# Altium footprint library Inductor.PcbLib: 39 footprints (part 2 of 3)
Each footprint in its own frame and in the unit in brackets; x right, y up, seen from the top. Pads: shape width x height; smd on the part's side, far side on the other; paste and mask are expansions set on the pad; w line width, h text height; cw(c..) or ccw(c..) is an arc to the next point about the centre after c.
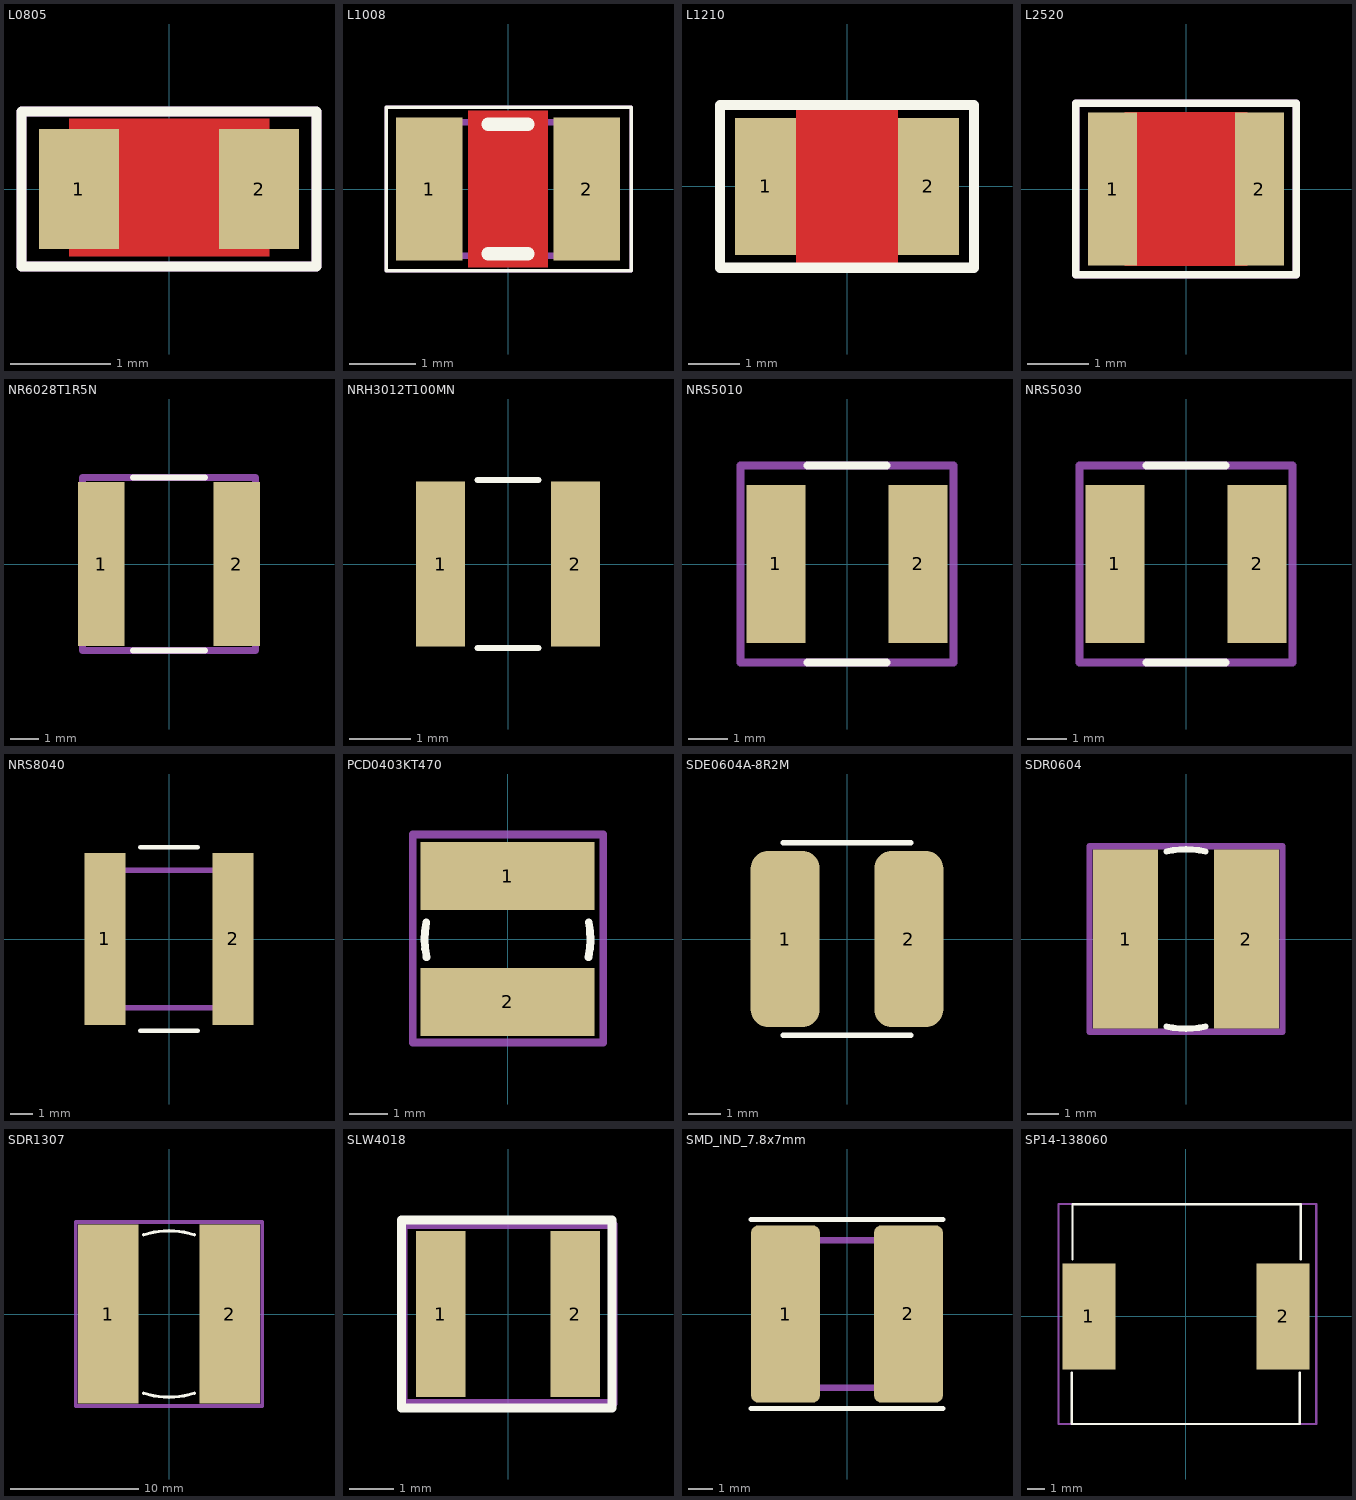
[diagram p1: the footprints below, top view; thin cyan lines are the x and y axes]

## L0805 [mm]
pads (2):
  rect 0.8x1.2 smd: 1(-0.9,0) 2(0.9,0)
Top Layer:
  pour cut-out: -1,0.7 -1,-0.675 1,-0.675 1,0.7
Top Overlay:
  lines w0.1: -1.475,-0.775 1.475,-0.775 1.475,0.775 -1.475,0.775 -1.475,-0.775
Mechanical 13:
  lines w0.1: -1.475,-0.775 -1.475,0.775 1.475,0.775 1.475,-0.775 -1.475,-0.775
  text ".Designator" at -1.375,-0.2 h0.8
Mechanical 15:
  lines w0.1: -1.475,-0.775 -1.475,0.775 1.475,0.775 1.475,-0.775 -1.475,-0.775
  text ".Comment" at -1.4,-0.225 h0.8
3D body "0805 SMD Capacitor.step": height 0.8, standoff 0.02, extent -1,-0.625 1,0.625

## L1008 [mm] "Chip Inductor, 2-Leads, Body 2.50x2.00mm, IPC Medium Density"
height 2
pads (2):
  rect 1x2.14 smd: 1(-1.18,0) 2(1.18,0)
Top Layer:
  pour cut-out: -0.6,1.175 -0.6,-1.175 0.6,-1.175 0.6,1.175
Top Overlay:
  lines w0.05: -1.825,-1.225 -1.825,1.225 1.85,1.225 1.85,-1.225 -1.825,-1.225
  lines w0.2: -0.3,-0.97 0.3,-0.97 ; -0.3,0.97 0.3,0.97
Mechanical 13:
  lines w0.1: -1.25,-1 1.25,-1 1.25,1 -1.25,1 -1.25,-1
Mechanical 15:
  lines w0.05: -1.825,-1.225 1.85,-1.225 1.85,1.225 -1.825,1.225 -1.825,-1.225
3D body "INDC2520X20N.step": height 2, standoff 0, extent -1.25,-1 1.25,1

## L1210 [mm]
pads (2):
  rect 1.2x2.7 smd: 1(-1.6,0) 2(1.6,0)
Top Layer:
  pour cut-out: -1,1.5 -1,-1.7 1,-1.7 1,1.5
Top Overlay:
  lines w0.2: -2.5,-1.6 -2.5,1.6 2.5,1.6 2.5,-1.6 -2.5,-1.6
Mechanical 13:
  text ".Designator" at -2.005,-0.381 h1
Mechanical 15:
  text ".Comment" at -1.751,-0.381 h1
3D body "User Library-3225.STEP": height 1.9, standoff 0, extent -1.6,-1.25 1.6,1.25

## L2520 [mm]
pads (2):
  rect 0.8x2.5 smd: 1(-1.2,0) 2(1.2,0)
Top Layer:
  pour cut-out: -1,1.25 -1,-1.25 1,-1.25 1,1.25
Top Overlay:
  lines w0.127: -1.8,-1.4 -1.8,1.4 1.8,1.4 1.8,-1.4 -1.8,-1.4
Mechanical 13:
  lines w0.127: -1.8,-1.4 -1.8,1.4 1.8,1.4 1.8,-1.4 -1.8,-1.4
  text ".Designator" at -0.943,-0.304 h1
Mechanical 15:
  lines w0.127: -1.8,-1.4 1.8,-1.4 1.8,1.4 -1.8,1.4 -1.8,-1.4
  text ".Comment" at -0.816,-0.304 h1
3D body: height 0.9, standoff 0, extent -1.3,-1 1.3,1

## NR6028T1R5N [mm] "FIXED IND 1.5UH 4.2A 20.8 MOHM"
pads (2):
  rect 1.6x5.7 smd: 1(-2.35,0) 2(2.35,0)
Top Overlay:
  lines w0.2: -1.25,-3 1.25,-3 ; -1.25,3 1.25,3
Mechanical 13:
  lines w0.254: -3,-3 -3,3 3,3 3,-3 -3,-3
  text ".Designator" at -2.921,-0.635 h1.5
Mechanical 15:
  lines w0.254: -3,-3 3,-3 3,3 -3,3 -3,-3
  text ".Comment" at -2.921,-0.635 h1.5
3D body "STEP-WE-LQS-6028-rev1.stp": height 2.83, standoff 0.02, extent -3,-3 3,3

## NRH3012T100MN [mm]
pads (2):
  rect 0.8x2.7 smd: 1(-1.1,0) 2(1.1,0)
Top Overlay:
  lines w0.1: -0.5,-1.375 -0.15,-1.375 0.5,-1.375 ; -0.5,1.375 -0.15,1.375 0.5,1.375

## NRS5010 [mm]
pads (2):
  rect 1.5x4 smd: 1(-1.8,0) 2(1.8,0)
Top Overlay:
  lines w0.2: -1,-2.5 1,-2.5 ; -1,2.5 1,2.5
Mechanical 13:
  lines w0.2: -2.7,-2.5 -2.7,2.5 2.7,2.5 2.7,-2.5 -2.7,-2.5
  text ".Designator" at -2.6,-0.2 h1.2
Mechanical 15:
  lines w0.2: -2.7,-2.5 2.7,-2.5 2.7,2.5 -2.7,2.5 -2.7,-2.5
  text ".Comment" at -2.6,-0.2 h1.2
3D body "User Library-SMDpowerInductor.step": height 3, standoff 0, extent -2.45,-2.45 2.45,2.45

## NRS5030 [mm]
pads (2):
  rect 1.5x4 smd: 1(-1.8,0) 2(1.8,0)
Top Overlay:
  lines w0.2: -1,-2.5 1,-2.5 ; -1,2.5 1,2.5
Mechanical 13:
  lines w0.2: -2.7,-2.5 -2.7,2.5 2.7,2.5 2.7,-2.5 -2.7,-2.5
  text ".Designator" at -2.6,-0.2 h1.2
Mechanical 15:
  lines w0.2: -2.7,-2.5 2.7,-2.5 2.7,2.5 -2.7,2.5 -2.7,-2.5
  text ".Comment" at -2.6,-0.2 h1.2
3D body "User Library-SMDpowerInductor.step": height 3, standoff 0, extent -2.45,-2.45 2.45,2.45

## NRS8040 [mm]
pads (2):
  rect 1.8x7.5 smd: 1(-2.8,0) 2(2.8,0)
Top Overlay:
  lines w0.2: -1.25,-4 1.25,-4 ; -1.25,4 1.25,4
Mechanical 13:
  lines w0.254: -3,-3 -3,3 3,3 3,-3 -3,-3
  text ".Designator" at -2.921,-0.635 h1.5
Mechanical 15:
  lines w0.254: -3,-3 3,-3 3,3 -3,3 -3,-3
  text ".Comment" at -2.921,-0.635 h1.5
3D body "STEP-WE-LQS-6028-rev1.stp": height 2.83, standoff 0.02, extent -3,-3 3,3

## PCD0403KT470 [mm]
pads (2):
  rect 4.5x1.75 smd: 1(0,1.625) 2(0,-1.625)
Top Overlay:
  lines w0.2: -2.1,0.43 ccw(c0,0) -2.09,-0.473 ; 2.09,-0.473 ccw(c0,0) 2.1,0.43
Mechanical 13:
  lines w0.2: -2.45,-2.675 -2.45,2.7 2.475,2.7 2.475,-2.675 -2.45,-2.675
  text ".Designator" at -1.6,-0.725 h1.5
3D body "SDR0403.stp": height 3.21, standoff 0, extent -2.25,-2.25 2.25,2.25

## SDE0604A-8R2M [mm] "FIXED IND 8.2UH 2.8A 90 MOHM SMD"
pads (2):
  rrect50% 2.15x5.5 smd: 1(-1.925,0) 2(1.925,0)
Top Overlay:
  lines w0.16: -2,-3 2,-3 ; -2,3 2,3
3D body "SDE0604A.STP": height 4.5, standoff 0, extent -2.775,-2.59 2.804,2.61

## SDR0604 [mm]
pads (2):
  rect 2.1x5.8 smd: 1(-1.95,0) 2(1.95,0)
Top Overlay:
  lines w0.2: -0.632,-2.83 ccw(c0,0) 0,-2.9 ccw(c0,0) 0.632,-2.83 ; 0,2.9 ccw(c0,0) -0.632,2.83 cw(c0,0) 0,2.9 ; 0,2.9 cw(c0,0) 0.632,2.83 ccw(c0,0) 0,2.9
Mechanical 13:
  lines w0.2: -3.125,-3 3.125,-3 3.125,3 -3.125,3 -3.125,-3
  text ".Designator" at -3,-0.8 h1.5
Mechanical 15:
  lines w0.2: -3.125,-3 -3.125,3 3.125,3 3.125,-3 -3.125,-3
  text ".Comment" at -2.925,-0.475 h1.5
3D body "sdr0604.stp": height 4.8, standoff 0, extent -2.9,-2.9 2.9,2.9

## SDR1307 [mm]
pads (2):
  rect 4.75x14 smd: 1(-4.75,0) 2(4.75,0)
Top Overlay:
  lines w0.254: -2,-6.2 ccw(c0,0) 2,-6.2 ; -2,6.2 cw(c0,0) 2,6.2
Mechanical 13:
  lines w0.3: -7.3,-7.2 7.3,-7.2 7.3,7.2 -7.3,7.2 -7.3,-7.2
  text ".Designator" at -6,-0.6 h2
Mechanical 15:
  lines w0.3: -7.3,-7.2 -7.3,7.2 7.3,7.2 7.3,-7.2 -7.3,-7.2
  text ".Comment" at -5.8,-0.6 h2
3D body "SDR1307.STP": height 7, standoff 0, extent -6.5,-6.5 6.5,6.5

## SLW4018 [mm]
pads (2):
  rect 1.1x3.7 smd: 1(-1.5,0) 2(1.5,0)
Top Overlay:
  lines w0.2: -2.375,-2.1 2.325,-2.1 2.325,2.1 -2.375,2.1 -2.375,-2.1
Mechanical 13:
  lines w0.2: -2.35,-2 -2.35,2 2.35,2 2.35,-2 -2.35,-2
  text ".Designator" at -0.75,-0.3 h1
3D body: height 1.8, standoff 0, extent -2.35,-2 2.35,2

## SMD_IND_7.8x7mm [mm]
pads (2):
  rrect20% 2.8x7.2 smd: 1(-2.5,0) 2(2.5,0)
Top Overlay:
  lines w0.2: -3.9,-3.85 3.9,-3.85 ; -3.9,3.85 3.9,3.85
Mechanical 13:
  lines w0.254: -3,-3 -3,3 3,3 3,-3 -3,-3
  text ".Designator" at -2.921,-0.635 h1.5
Mechanical 15:
  lines w0.254: -3,-3 3,-3 3,3 -3,3 -3,-3
  text ".Comment" at -2.921,-0.635 h1.5
3D body "STEP-WE-LQS-6028-rev1.stp": height 2.83, standoff 0.02, extent -3,-3 3,3

## SP14-138060 [mm]
pads (2):
  rect 3x6 smd: 1(-5.5,0) 2(5.5,0)
Top Overlay:
  lines w0.127: -6.475,-3.175 -6.475,-6.1 6.45,-6.1 6.45,-3.175 ; -6.425,3.225 -6.425,6.35 6.5,6.35 6.5,3.225
Mechanical 13:
  lines w0.127: -7.225,-6.1 -7.225,6.375 7.375,6.375 7.375,-6.1 -7.225,-6.1
  text ".Designator" at -2.268,-0.129 h1
Mechanical 15:
  lines w0.127: -7.225,-6.1 7.375,-6.1 7.375,6.375 -7.225,6.375 -7.225,-6.1
  text ".Comment" at -2.141,-0.129 h1
3D body "SRP1265A series.stp": height 6.31, standoff 0, extent -6.4,-6.1 6.5,6.4